# Altium footprint library ref-packages.PCBLIB: 1544 footprints (part 81 of 103) (continued)
## SQFP-S-36X36-280 [mil] (continued)
Top Overlay:
  circle w10: c-637.8,-637.8 r29.53
  lines w8: -699.61,-699.21 699.21,-699.21 699.21,699.21 -699.61,699.21 -699.61,-699.21
Mechanical 16:
  drawing of 284 lines, arcs and shapes, not listed
Mechanical 27:
  lines w7.87: -783.46,-783.46 -783.46,783.46 783.46,783.46 783.46,-783.46 -783.46,-783.46

## SQFP-S-36X36-344 [mm]
pads (344):
  rect 0.25x1.6 smd: 1(-17,-18.6) 2(-16.6,-18.6) 3(-16.2,-18.6) 4(-15.8,-18.6) 5(-15.4,-18.6) 6(-15,-18.6) 7(-14.6,-18.6) 8(-14.2,-18.6) 9(-13.8,-18.6) 10(-13.4,-18.6) 11(-13,-18.6) 12(-12.6,-18.6) 13(-12.2,-18.6) 14(-11.8,-18.6) 15(-11.4,-18.6) 16(-11,-18.6) 17(-10.6,-18.6) 18(-10.2,-18.6) 19(-9.8,-18.6) 20(-9.4,-18.6) 21(-9,-18.6) 22(-8.6,-18.6) 23(-8.2,-18.6) 24(-7.8,-18.6) 25(-7.4,-18.6) 26(-7,-18.6) 27(-6.6,-18.6) 28(-6.2,-18.6) 29(-5.8,-18.6) 30(-5.4,-18.6) 31(-5,-18.6) 32(-4.6,-18.6) 33(-4.2,-18.6) 34(-3.8,-18.6) 35(-3.4,-18.6) 36(-3,-18.6) 37(-2.6,-18.6) 38(-2.2,-18.6) 39(-1.8,-18.6) 40(-1.4,-18.6) 41(-1,-18.6) 42(-0.6,-18.6) 43(-0.2,-18.6) 44(0.2,-18.6) 45(0.6,-18.6) 46(1,-18.6) 47(1.4,-18.6) 48(1.8,-18.6) 49(2.2,-18.6) 50(2.6,-18.6) 51(3,-18.6) 52(3.4,-18.6) 53(3.8,-18.6) 54(4.2,-18.6) 55(4.6,-18.6) 56(5,-18.6) 57(5.4,-18.6) 58(5.8,-18.6) 59(6.2,-18.6) 60(6.6,-18.6) 61(7,-18.6) 62(7.4,-18.6) 63(7.8,-18.6) 64(8.2,-18.6) 65(8.6,-18.6) 66(9,-18.6) 67(9.4,-18.6) 68(9.8,-18.6) 69(10.2,-18.6) 70(10.6,-18.6) 71(11,-18.6) 72(11.4,-18.6) 73(11.8,-18.6) 74(12.2,-18.6) 75(12.6,-18.6) 76(13,-18.6) 77(13.4,-18.6) 78(13.8,-18.6) 79(14.2,-18.6) 80(14.6,-18.6) 81(15,-18.6) 82(15.4,-18.6) 83(15.8,-18.6) 84(16.2,-18.6) 85(16.6,-18.6) 86(17,-18.6) 173(17,18.6) 174(16.6,18.6) 175(16.2,18.6) 176(15.8,18.6) 177(15.4,18.6) 178(15,18.6) 179(14.6,18.6) 180(14.2,18.6) 181(13.8,18.6) 182(13.4,18.6) 183(13,18.6) 184(12.6,18.6) 185(12.2,18.6) 186(11.8,18.6) 187(11.4,18.6) 188(11,18.6) 189(10.6,18.6) 190(10.2,18.6) 191(9.8,18.6) 192(9.4,18.6) 193(9,18.6) 194(8.6,18.6) 195(8.2,18.6) 196(7.8,18.6) 197(7.4,18.6) 198(7,18.6) 199(6.6,18.6) 200(6.2,18.6) 201(5.8,18.6) 202(5.4,18.6) 203(5,18.6) 204(4.6,18.6) 205(4.2,18.6) 206(3.8,18.6) 207(3.4,18.6) 208(3,18.6) 209(2.6,18.6) 210(2.2,18.6) 211(1.8,18.6) 212(1.4,18.6) 213(1,18.6) 214(0.6,18.6) 215(0.2,18.6) 216(-0.2,18.6) 217(-0.6,18.6) 218(-1,18.6) 219(-1.4,18.6) 220(-1.8,18.6) 221(-2.2,18.6) 222(-2.6,18.6) 223(-3,18.6) 224(-3.4,18.6) 225(-3.8,18.6) 226(-4.2,18.6) 227(-4.6,18.6) 228(-5,18.6) 229(-5.4,18.6) 230(-5.8,18.6) 231(-6.2,18.6) 232(-6.6,18.6) 233(-7,18.6) 234(-7.4,18.6) 235(-7.8,18.6) 236(-8.2,18.6) 237(-8.6,18.6) 238(-9,18.6) 239(-9.4,18.6) 240(-9.8,18.6) 241(-10.2,18.6) 242(-10.6,18.6) 243(-11,18.6) 244(-11.4,18.6) 245(-11.8,18.6) 246(-12.2,18.6) 247(-12.6,18.6) 248(-13,18.6) 249(-13.4,18.6) 250(-13.8,18.6) 251(-14.2,18.6) 252(-14.6,18.6) 253(-15,18.6) 254(-15.4,18.6) 255(-15.8,18.6) 256(-16.2,18.6) 257(-16.6,18.6) 258(-17,18.6)
  rect 1.6x0.25 smd: 87(18.6,-17) 88(18.6,-16.6) 89(18.6,-16.2) 90(18.6,-15.8) 91(18.6,-15.4) 92(18.6,-15) 93(18.6,-14.6) 94(18.6,-14.2) 95(18.6,-13.8) 96(18.6,-13.4) 97(18.6,-13) 98(18.6,-12.6) 99(18.6,-12.2) 100(18.6,-11.8) 101(18.6,-11.4) 102(18.6,-11) 103(18.6,-10.6) 104(18.6,-10.2) 105(18.6,-9.8) 106(18.6,-9.4) 107(18.6,-9) 108(18.6,-8.6) 109(18.6,-8.2) 110(18.6,-7.8) 111(18.6,-7.4) 112(18.6,-7) 113(18.6,-6.6) 114(18.6,-6.2) 115(18.6,-5.8) 116(18.6,-5.4) 117(18.6,-5) 118(18.6,-4.6) 119(18.6,-4.2) 120(18.6,-3.8) 121(18.6,-3.4) 122(18.6,-3) 123(18.6,-2.6) 124(18.6,-2.2) 125(18.6,-1.8) 126(18.6,-1.4) 127(18.6,-1) 128(18.6,-0.6) 129(18.6,-0.2) 130(18.6,0.2) 131(18.6,0.6) 132(18.6,1) 133(18.6,1.4) 134(18.6,1.8) 135(18.6,2.2) 136(18.6,2.6) 137(18.6,3) 138(18.6,3.4) 139(18.6,3.8) 140(18.6,4.2) 141(18.6,4.6) 142(18.6,5) 143(18.6,5.4) 144(18.6,5.8) 145(18.6,6.2) 146(18.6,6.6) 147(18.6,7) 148(18.6,7.4) 149(18.6,7.8) 150(18.6,8.2) 151(18.6,8.6) 152(18.6,9) 153(18.6,9.4) 154(18.6,9.8) 155(18.6,10.2) 156(18.6,10.6) 157(18.6,11) 158(18.6,11.4) 159(18.6,11.8) 160(18.6,12.2) 161(18.6,12.6) 162(18.6,13) 163(18.6,13.4) 164(18.6,13.8) 165(18.6,14.2) 166(18.6,14.6) 167(18.6,15) 168(18.6,15.4) 169(18.6,15.8) 170(18.6,16.2) 171(18.6,16.6) 172(18.6,17) 259(-18.6,17) 260(-18.6,16.6) 261(-18.6,16.2) 262(-18.6,15.8) 263(-18.6,15.4) 264(-18.6,15) 265(-18.6,14.6) 266(-18.6,14.2) 267(-18.6,13.8) 268(-18.6,13.4) 269(-18.6,13) 270(-18.6,12.6) 271(-18.6,12.2) 272(-18.6,11.8) 273(-18.6,11.4) 274(-18.6,11) 275(-18.6,10.6) 276(-18.6,10.2) 277(-18.6,9.8) 278(-18.6,9.4) 279(-18.6,9) 280(-18.6,8.6) 281(-18.6,8.2) 282(-18.6,7.8) 283(-18.6,7.4) 284(-18.6,7) 285(-18.6,6.6) 286(-18.6,6.2) 287(-18.6,5.8) 288(-18.6,5.4) 289(-18.6,5) 290(-18.6,4.6) 291(-18.6,4.2) 292(-18.6,3.8) 293(-18.6,3.4) 294(-18.6,3) 295(-18.6,2.6) 296(-18.6,2.2) 297(-18.6,1.8) 298(-18.6,1.4) 299(-18.6,1) 300(-18.6,0.6) 301(-18.6,0.2) 302(-18.6,-0.2) 303(-18.6,-0.6) 304(-18.6,-1) 305(-18.6,-1.4) 306(-18.6,-1.8) 307(-18.6,-2.2) 308(-18.6,-2.6) 309(-18.6,-3) 310(-18.6,-3.4) 311(-18.6,-3.8) 312(-18.6,-4.2) 313(-18.6,-4.6) 314(-18.6,-5) 315(-18.6,-5.4) 316(-18.6,-5.8) 317(-18.6,-6.2) 318(-18.6,-6.6) 319(-18.6,-7) 320(-18.6,-7.4) 321(-18.6,-7.8) 322(-18.6,-8.2) 323(-18.6,-8.6) 324(-18.6,-9) 325(-18.6,-9.4) 326(-18.6,-9.8) 327(-18.6,-10.2) 328(-18.6,-10.6) 329(-18.6,-11) 330(-18.6,-11.4) 331(-18.6,-11.8) 332(-18.6,-12.2) 333(-18.6,-12.6) 334(-18.6,-13) 335(-18.6,-13.4) 336(-18.6,-13.8) 337(-18.6,-14.2) 338(-18.6,-14.6) 339(-18.6,-15) 340(-18.6,-15.4) 341(-18.6,-15.8) 342(-18.6,-16.2) 343(-18.6,-16.6) 344(-18.6,-17)
Top Overlay:
  circle w0.254: c-16.2,-16.2 r0.75
  lines w0.203: -17.77,-17.76 17.76,-17.76 17.76,17.76 -17.77,17.76 -17.77,-17.76
Mechanical 16:
  drawing of 348 lines, arcs and shapes, not listed
Mechanical 27:
  lines w0.2: -19.9,-19.9 -19.9,19.9 19.9,19.9 19.9,-19.9 -19.9,-19.9

## SQFP-S-36X36-352 [mm]
pads (352):
  rect 0.25x1.6 smd: 1(-17.4,-18.6) 2(-17,-18.6) 3(-16.6,-18.6) 4(-16.2,-18.6) 5(-15.8,-18.6) 6(-15.4,-18.6) 7(-15,-18.6) 8(-14.6,-18.6) 9(-14.2,-18.6) 10(-13.8,-18.6) 11(-13.4,-18.6) 12(-13,-18.6) 13(-12.6,-18.6) 14(-12.2,-18.6) 15(-11.8,-18.6) 16(-11.4,-18.6) 17(-11,-18.6) 18(-10.6,-18.6) 19(-10.2,-18.6) 20(-9.8,-18.6) 21(-9.4,-18.6) 22(-9,-18.6) 23(-8.6,-18.6) 24(-8.2,-18.6) 25(-7.8,-18.6) 26(-7.4,-18.6) 27(-7,-18.6) 28(-6.6,-18.6) 29(-6.2,-18.6) 30(-5.8,-18.6) 31(-5.4,-18.6) 32(-5,-18.6) 33(-4.6,-18.6) 34(-4.2,-18.6) 35(-3.8,-18.6) 36(-3.4,-18.6) 37(-3,-18.6) 38(-2.6,-18.6) 39(-2.2,-18.6) 40(-1.8,-18.6) 41(-1.4,-18.6) 42(-1,-18.6) 43(-0.6,-18.6) 44(-0.2,-18.6) 45(0.2,-18.6) 46(0.6,-18.6) 47(1,-18.6) 48(1.4,-18.6) 49(1.8,-18.6) 50(2.2,-18.6) 51(2.6,-18.6) 52(3,-18.6) 53(3.4,-18.6) 54(3.8,-18.6) 55(4.2,-18.6) 56(4.6,-18.6) 57(5,-18.6) 58(5.4,-18.6) 59(5.8,-18.6) 60(6.2,-18.6) 61(6.6,-18.6) 62(7,-18.6) 63(7.4,-18.6) 64(7.8,-18.6) 65(8.2,-18.6) 66(8.6,-18.6) 67(9,-18.6) 68(9.4,-18.6) 69(9.8,-18.6) 70(10.2,-18.6) 71(10.6,-18.6) 72(11,-18.6) 73(11.4,-18.6) 74(11.8,-18.6) 75(12.2,-18.6) 76(12.6,-18.6) 77(13,-18.6) 78(13.4,-18.6) 79(13.8,-18.6) 80(14.2,-18.6) 81(14.6,-18.6) 82(15,-18.6) 83(15.4,-18.6) 84(15.8,-18.6) 85(16.2,-18.6) 86(16.6,-18.6) 87(17,-18.6) 88(17.4,-18.6) 177(17.4,18.6) 178(17,18.6) 179(16.6,18.6) 180(16.2,18.6) 181(15.8,18.6) 182(15.4,18.6) 183(15,18.6) 184(14.6,18.6) 185(14.2,18.6) 186(13.8,18.6) 187(13.4,18.6) 188(13,18.6) 189(12.6,18.6) 190(12.2,18.6) 191(11.8,18.6) 192(11.4,18.6) 193(11,18.6) 194(10.6,18.6) 195(10.2,18.6) 196(9.8,18.6) 197(9.4,18.6) 198(9,18.6) 199(8.6,18.6) 200(8.2,18.6) 201(7.8,18.6) 202(7.4,18.6) 203(7,18.6) 204(6.6,18.6) 205(6.2,18.6) 206(5.8,18.6) 207(5.4,18.6) 208(5,18.6) 209(4.6,18.6) 210(4.2,18.6) 211(3.8,18.6) 212(3.4,18.6) 213(3,18.6) 214(2.6,18.6) 215(2.2,18.6) 216(1.8,18.6) 217(1.4,18.6) 218(1,18.6) 219(0.6,18.6) 220(0.2,18.6) 221(-0.2,18.6) 222(-0.6,18.6) 223(-1,18.6) 224(-1.4,18.6) 225(-1.8,18.6) 226(-2.2,18.6) 227(-2.6,18.6) 228(-3,18.6) 229(-3.4,18.6) 230(-3.8,18.6) 231(-4.2,18.6) 232(-4.6,18.6) 233(-5,18.6) 234(-5.4,18.6) 235(-5.8,18.6) 236(-6.2,18.6) 237(-6.6,18.6) 238(-7,18.6) 239(-7.4,18.6) 240(-7.8,18.6) 241(-8.2,18.6) 242(-8.6,18.6) 243(-9,18.6) 244(-9.4,18.6) 245(-9.8,18.6) 246(-10.2,18.6) 247(-10.6,18.6) 248(-11,18.6) 249(-11.4,18.6) 250(-11.8,18.6) 251(-12.2,18.6) 252(-12.6,18.6) 253(-13,18.6) 254(-13.4,18.6) 255(-13.8,18.6) 256(-14.2,18.6) 257(-14.6,18.6) 258(-15,18.6) 259(-15.4,18.6) 260(-15.8,18.6) 261(-16.2,18.6) 262(-16.6,18.6) 263(-17,18.6) 264(-17.4,18.6)
  rect 1.6x0.25 smd: 89(18.6,-17.4) 90(18.6,-17) 91(18.6,-16.6) 92(18.6,-16.2) 93(18.6,-15.8) 94(18.6,-15.4) 95(18.6,-15) 96(18.6,-14.6) 97(18.6,-14.2) 98(18.6,-13.8) 99(18.6,-13.4) 100(18.6,-13) 101(18.6,-12.6) 102(18.6,-12.2) 103(18.6,-11.8) 104(18.6,-11.4) 105(18.6,-11) 106(18.6,-10.6) 107(18.6,-10.2) 108(18.6,-9.8) 109(18.6,-9.4) 110(18.6,-9) 111(18.6,-8.6) 112(18.6,-8.2) 113(18.6,-7.8) 114(18.6,-7.4) 115(18.6,-7) 116(18.6,-6.6) 117(18.6,-6.2) 118(18.6,-5.8) 119(18.6,-5.4) 120(18.6,-5) 121(18.6,-4.6) 122(18.6,-4.2) 123(18.6,-3.8) 124(18.6,-3.4) 125(18.6,-3) 126(18.6,-2.6) 127(18.6,-2.2) 128(18.6,-1.8) 129(18.6,-1.4) 130(18.6,-1) 131(18.6,-0.6) 132(18.6,-0.2) 133(18.6,0.2) 134(18.6,0.6) 135(18.6,1) 136(18.6,1.4) 137(18.6,1.8) 138(18.6,2.2) 139(18.6,2.6) 140(18.6,3) 141(18.6,3.4) 142(18.6,3.8) 143(18.6,4.2) 144(18.6,4.6) 145(18.6,5) 146(18.6,5.4) 147(18.6,5.8) 148(18.6,6.2) 149(18.6,6.6) 150(18.6,7) 151(18.6,7.4) 152(18.6,7.8) 153(18.6,8.2) 154(18.6,8.6) 155(18.6,9) 156(18.6,9.4) 157(18.6,9.8) 158(18.6,10.2) 159(18.6,10.6) 160(18.6,11) 161(18.6,11.4) 162(18.6,11.8) 163(18.6,12.2) 164(18.6,12.6) 165(18.6,13) 166(18.6,13.4) 167(18.6,13.8) 168(18.6,14.2) 169(18.6,14.6) 170(18.6,15) 171(18.6,15.4) 172(18.6,15.8) 173(18.6,16.2) 174(18.6,16.6) 175(18.6,17) 176(18.6,17.4) 265(-18.6,17.4) 266(-18.6,17) 267(-18.6,16.6) 268(-18.6,16.2) 269(-18.6,15.8) 270(-18.6,15.4) 271(-18.6,15) 272(-18.6,14.6) 273(-18.6,14.2) 274(-18.6,13.8) 275(-18.6,13.4) 276(-18.6,13) 277(-18.6,12.6) 278(-18.6,12.2) 279(-18.6,11.8) 280(-18.6,11.4) 281(-18.6,11) 282(-18.6,10.6) 283(-18.6,10.2) 284(-18.6,9.8) 285(-18.6,9.4) 286(-18.6,9) 287(-18.6,8.6) 288(-18.6,8.2) 289(-18.6,7.8) 290(-18.6,7.4) 291(-18.6,7) 292(-18.6,6.6) 293(-18.6,6.2) 294(-18.6,5.8) 295(-18.6,5.4) 296(-18.6,5) 297(-18.6,4.6) 298(-18.6,4.2) 299(-18.6,3.8) 300(-18.6,3.4) 301(-18.6,3) 302(-18.6,2.6) 303(-18.6,2.2) 304(-18.6,1.8) 305(-18.6,1.4) 306(-18.6,1) 307(-18.6,0.6) 308(-18.6,0.2) 309(-18.6,-0.2) 310(-18.6,-0.6) 311(-18.6,-1) 312(-18.6,-1.4) 313(-18.6,-1.8) 314(-18.6,-2.2) 315(-18.6,-2.6) 316(-18.6,-3) 317(-18.6,-3.4) 318(-18.6,-3.8) 319(-18.6,-4.2) 320(-18.6,-4.6) 321(-18.6,-5) 322(-18.6,-5.4) 323(-18.6,-5.8) 324(-18.6,-6.2) 325(-18.6,-6.6) 326(-18.6,-7) 327(-18.6,-7.4) 328(-18.6,-7.8) 329(-18.6,-8.2) 330(-18.6,-8.6) 331(-18.6,-9) 332(-18.6,-9.4) 333(-18.6,-9.8) 334(-18.6,-10.2) 335(-18.6,-10.6) 336(-18.6,-11) 337(-18.6,-11.4) 338(-18.6,-11.8) 339(-18.6,-12.2) 340(-18.6,-12.6) 341(-18.6,-13) 342(-18.6,-13.4) 343(-18.6,-13.8) 344(-18.6,-14.2) 345(-18.6,-14.6) 346(-18.6,-15) 347(-18.6,-15.4) 348(-18.6,-15.8) 349(-18.6,-16.2) 350(-18.6,-16.6) 351(-18.6,-17) 352(-18.6,-17.4)
Top Overlay:
  circle w0.254: c-16.2,-16.2 r0.75
  lines w0.203: -17.77,-17.76 17.76,-17.76 17.76,17.76 -17.77,17.76 -17.77,-17.76
Mechanical 16:
  drawing of 356 lines, arcs and shapes, not listed
Mechanical 27:
  lines w0.2: -19.9,-19.9 -19.9,19.9 19.9,19.9 19.9,-19.9 -19.9,-19.9

## SQFP-S-36X36-456 [mm]
pads (464):
  rect 0.17x1.6 smd: 1(-17.25,-18.9) 2(-16.95,-18.9) 3(-16.65,-18.9) 4(-16.35,-18.9) 5(-16.05,-18.9) 6(-15.75,-18.9) 7(-15.45,-18.9) 8(-15.15,-18.9) 9(-14.85,-18.9) 10(-14.55,-18.9) 11(-14.25,-18.9) 12(-13.95,-18.9) 13(-13.65,-18.9) 14(-13.35,-18.9) 15(-13.05,-18.9) 16(-12.75,-18.9) 17(-12.45,-18.9) 18(-12.15,-18.9) 19(-11.85,-18.9) 20(-11.55,-18.9) 21(-11.25,-18.9) 22(-10.95,-18.9) 23(-10.65,-18.9) 24(-10.35,-18.9) 25(-10.05,-18.9) 26(-9.75,-18.9) 27(-9.45,-18.9) 28(-9.15,-18.9) 29(-8.85,-18.9) 30(-8.55,-18.9) 31(-8.25,-18.9) 32(-7.95,-18.9) 33(-7.65,-18.9) 34(-7.35,-18.9) 35(-7.05,-18.9) 36(-6.75,-18.9) 37(-6.45,-18.9) 38(-6.15,-18.9) 39(-5.85,-18.9) 40(-5.55,-18.9) 41(-5.25,-18.9) 42(-4.95,-18.9) 43(-4.65,-18.9) 44(-4.35,-18.9) 45(-4.05,-18.9) 46(-3.75,-18.9) 47(-3.45,-18.9) 48(-3.15,-18.9) 49(-2.85,-18.9) 50(-2.55,-18.9) 51(-2.25,-18.9) 52(-1.95,-18.9) 53(-1.65,-18.9) 54(-1.35,-18.9) 55(-1.05,-18.9) 56(-0.75,-18.9) 57(-0.45,-18.9) 58(-0.15,-18.9) 59(0.15,-18.9) 60(0.45,-18.9) 61(0.75,-18.9) 62(1.05,-18.9) 63(1.35,-18.9) 64(1.65,-18.9) 65(1.95,-18.9) 66(2.25,-18.9) 67(2.55,-18.9) 68(2.85,-18.9) 69(3.15,-18.9) 70(3.45,-18.9) 71(3.75,-18.9) 72(4.05,-18.9) 73(4.35,-18.9) 74(4.65,-18.9) 75(4.95,-18.9) 76(5.25,-18.9) 77(5.55,-18.9) 78(5.85,-18.9) 79(6.15,-18.9) 80(6.45,-18.9) 81(6.75,-18.9) 82(7.05,-18.9) 83(7.35,-18.9) 84(7.65,-18.9) 85(7.95,-18.9) 86(8.25,-18.9) 87(8.55,-18.9) 88(8.85,-18.9) 89(9.15,-18.9) 90(9.45,-18.9) 91(9.75,-18.9) 92(10.05,-18.9) 93(10.35,-18.9) 94(10.65,-18.9) 95(10.95,-18.9) 96(11.25,-18.9) 97(11.55,-18.9) 98(11.85,-18.9) 99(12.15,-18.9) 100(12.45,-18.9) 101(12.75,-18.9) 102(13.05,-18.9) 103(13.35,-18.9) 104(13.65,-18.9) 105(13.95,-18.9) 106(14.25,-18.9) 107(14.55,-18.9) 108(14.85,-18.9) 109(15.15,-18.9) 110(15.45,-18.9) 111(15.75,-18.9) 112(16.05,-18.9) 113(16.35,-18.9) 114(16.65,-18.9) 115(16.95,-18.9) 116(17.25,-18.9) 233(17.25,18.9) 234(16.95,18.9) 235(16.65,18.9) 236(16.35,18.9) 237(16.05,18.9) 238(15.75,18.9) 239(15.45,18.9) 240(15.15,18.9) 241(14.85,18.9) 242(14.55,18.9) 243(14.25,18.9) 244(13.95,18.9) 245(13.65,18.9) 246(13.35,18.9) 247(13.05,18.9) 248(12.75,18.9) 249(12.45,18.9) 250(12.15,18.9) 251(11.85,18.9) 252(11.55,18.9) 253(11.25,18.9) 254(10.95,18.9) 255(10.65,18.9) 256(10.35,18.9) 257(10.05,18.9) 258(9.75,18.9) 259(9.45,18.9) 260(9.15,18.9) 261(8.85,18.9) 262(8.55,18.9) 263(8.25,18.9) 264(7.95,18.9) 265(7.65,18.9) 266(7.35,18.9) 267(7.05,18.9) 268(6.75,18.9) 269(6.45,18.9) 270(6.15,18.9) 271(5.85,18.9) 272(5.55,18.9) 273(5.25,18.9) 274(4.95,18.9) 275(4.65,18.9) 276(4.35,18.9) 277(4.05,18.9) 278(3.75,18.9) 279(3.45,18.9) 280(3.15,18.9) 281(2.85,18.9) 282(2.55,18.9) 283(2.25,18.9) 284(1.95,18.9) 285(1.65,18.9) 286(1.35,18.9) 287(1.05,18.9) 288(0.75,18.9) 289(0.45,18.9) 290(0.15,18.9) 291(-0.15,18.9) 292(-0.45,18.9) 293(-0.75,18.9) 294(-1.05,18.9) 295(-1.35,18.9) 296(-1.65,18.9) 297(-1.95,18.9) 298(-2.25,18.9) 299(-2.55,18.9) 300(-2.85,18.9) 301(-3.15,18.9) 302(-3.45,18.9) 303(-3.75,18.9) 304(-4.05,18.9) 305(-4.35,18.9) 306(-4.65,18.9) 307(-4.95,18.9) 308(-5.25,18.9) 309(-5.55,18.9) 310(-5.85,18.9) 311(-6.15,18.9) 312(-6.45,18.9) 313(-6.75,18.9) 314(-7.05,18.9) 315(-7.35,18.9) 316(-7.65,18.9) 317(-7.95,18.9) 318(-8.25,18.9) 319(-8.55,18.9) 320(-8.85,18.9) 321(-9.15,18.9) 322(-9.45,18.9) 323(-9.75,18.9) 324(-10.05,18.9) 325(-10.35,18.9) 326(-10.65,18.9) 327(-10.95,18.9) 328(-11.25,18.9) 329(-11.55,18.9) 330(-11.85,18.9) 331(-12.15,18.9) 332(-12.45,18.9) 333(-12.75,18.9) 334(-13.05,18.9) 335(-13.35,18.9) 336(-13.65,18.9) 337(-13.95,18.9) 338(-14.25,18.9) 339(-14.55,18.9) 340(-14.85,18.9) 341(-15.15,18.9) 342(-15.45,18.9) 343(-15.75,18.9) 344(-16.05,18.9) 345(-16.35,18.9) 346(-16.65,18.9) 347(-16.95,18.9) 348(-17.25,18.9)
  rect 1.6x0.17 smd: 117(18.9,-17.25) 118(18.9,-16.95) 119(18.9,-16.65) 120(18.9,-16.35) 121(18.9,-16.05) 122(18.9,-15.75) 123(18.9,-15.45) 124(18.9,-15.15) 125(18.9,-14.85) 126(18.9,-14.55) 127(18.9,-14.25) 128(18.9,-13.95) 129(18.9,-13.65) 130(18.9,-13.35) 131(18.9,-13.05) 132(18.9,-12.75) 133(18.9,-12.45) 134(18.9,-12.15) 135(18.9,-11.85) 136(18.9,-11.55) 137(18.9,-11.25) 138(18.9,-10.95) 139(18.9,-10.65) 140(18.9,-10.35) 141(18.9,-10.05) 142(18.9,-9.75) 143(18.9,-9.45) 144(18.9,-9.15) 145(18.9,-8.85) 146(18.9,-8.55) 147(18.9,-8.25) 148(18.9,-7.95) 149(18.9,-7.65) 150(18.9,-7.35) 151(18.9,-7.05) 152(18.9,-6.75) 153(18.9,-6.45) 154(18.9,-6.15) 155(18.9,-5.85) 156(18.9,-5.55) 157(18.9,-5.25) 158(18.9,-4.95) 159(18.9,-4.65) 160(18.9,-4.35) 161(18.9,-4.05) 162(18.9,-3.75) 163(18.9,-3.45) 164(18.9,-3.15) 165(18.9,-2.85) 166(18.9,-2.55) 167(18.9,-2.25) 168(18.9,-1.95) 169(18.9,-1.65) 170(18.9,-1.35) 171(18.9,-1.05) 172(18.9,-0.75) 173(18.9,-0.45) 174(18.9,-0.15) 175(18.9,0.15) 176(18.9,0.45) 177(18.9,0.75) 178(18.9,1.05) 179(18.9,1.35) 180(18.9,1.65) 181(18.9,1.95) 182(18.9,2.25) 183(18.9,2.55) 184(18.9,2.85) 185(18.9,3.15) 186(18.9,3.45) 187(18.9,3.75) 188(18.9,4.05) 189(18.9,4.35) 190(18.9,4.65) 191(18.9,4.95) 192(18.9,5.25) 193(18.9,5.55) 194(18.9,5.85) 195(18.9,6.15) 196(18.9,6.45) 197(18.9,6.75) 198(18.9,7.05) 199(18.9,7.35) 200(18.9,7.65) 201(18.9,7.95) 202(18.9,8.25) 203(18.9,8.55) 204(18.9,8.85) 205(18.9,9.15) 206(18.9,9.45) 207(18.9,9.75) 208(18.9,10.05) 209(18.9,10.35) 210(18.9,10.65) 211(18.9,10.95) 212(18.9,11.25) 213(18.9,11.55) 214(18.9,11.85) 215(18.9,12.15) 216(18.9,12.45) 217(18.9,12.75) 218(18.9,13.05) 219(18.9,13.35) 220(18.9,13.65) 221(18.9,13.95) 222(18.9,14.25) 223(18.9,14.55) 224(18.9,14.85) 225(18.9,15.15) 226(18.9,15.45) 227(18.9,15.75) 228(18.9,16.05) 229(18.9,16.35) 230(18.9,16.65) 231(18.9,16.95) 232(18.9,17.25) 349(-18.9,17.25) 350(-18.9,16.95) 351(-18.9,16.65) 352(-18.9,16.35) 353(-18.9,16.05) 354(-18.9,15.75) 355(-18.9,15.45) 356(-18.9,15.15) 357(-18.9,14.85) 358(-18.9,14.55) 359(-18.9,14.25) 360(-18.9,13.95) 361(-18.9,13.65) 362(-18.9,13.35) 363(-18.9,13.05) 364(-18.9,12.75) 365(-18.9,12.45) 366(-18.9,12.15) 367(-18.9,11.85) 368(-18.9,11.55) 369(-18.9,11.25) 370(-18.9,10.95) 371(-18.9,10.65) 372(-18.9,10.35) 373(-18.9,10.05) 374(-18.9,9.75) 375(-18.9,9.45) 376(-18.9,9.15) 377(-18.9,8.85) 378(-18.9,8.55) 379(-18.9,8.25) 380(-18.9,7.95) 381(-18.9,7.65) 382(-18.9,7.35) 383(-18.9,7.05) 384(-18.9,6.75) 385(-18.9,6.45) 386(-18.9,6.15) 387(-18.9,5.85) 388(-18.9,5.55) 389(-18.9,5.25) 390(-18.9,4.95) 391(-18.9,4.65) 392(-18.9,4.35) 393(-18.9,4.05) 394(-18.9,3.75) 395(-18.9,3.45) 396(-18.9,3.15) 397(-18.9,2.85) 398(-18.9,2.55) 399(-18.9,2.25) 400(-18.9,1.95) 401(-18.9,1.65) 402(-18.9,1.35) 403(-18.9,1.05) 404(-18.9,0.75) 405(-18.9,0.45) 406(-18.9,0.15) 407(-18.9,-0.15) 408(-18.9,-0.45) 409(-18.9,-0.75) 410(-18.9,-1.05) 411(-18.9,-1.35) 412(-18.9,-1.65) 413(-18.9,-1.95) 414(-18.9,-2.25) 415(-18.9,-2.55) 416(-18.9,-2.85) 417(-18.9,-3.15) 418(-18.9,-3.45) 419(-18.9,-3.75) 420(-18.9,-4.05) 421(-18.9,-4.35) 422(-18.9,-4.65) 423(-18.9,-4.95) 424(-18.9,-5.25) 425(-18.9,-5.55) 426(-18.9,-5.85) 427(-18.9,-6.15) 428(-18.9,-6.45) 429(-18.9,-6.75) 430(-18.9,-7.05) 431(-18.9,-7.35) 432(-18.9,-7.65) 433(-18.9,-7.95) 434(-18.9,-8.25) 435(-18.9,-8.55) 436(-18.9,-8.85) 437(-18.9,-9.15) 438(-18.9,-9.45) 439(-18.9,-9.75) 440(-18.9,-10.05) 441(-18.9,-10.35) 442(-18.9,-10.65) 443(-18.9,-10.95) 444(-18.9,-11.25) 445(-18.9,-11.55) 446(-18.9,-11.85) 447(-18.9,-12.15) 448(-18.9,-12.45) 449(-18.9,-12.75) 450(-18.9,-13.05) 451(-18.9,-13.35) 452(-18.9,-13.65) 453(-18.9,-13.95) 454(-18.9,-14.25) 455(-18.9,-14.55) 456(-18.9,-14.85) 457(-18.9,-15.15) 458(-18.9,-15.45) 459(-18.9,-15.75) 460(-18.9,-16.05) 461(-18.9,-16.35) 462(-18.9,-16.65) 463(-18.9,-16.95) 464(-18.9,-17.25)
Top Overlay:
  circle w0.254: c-16.2,-16.2 r0.75
  lines w0.203: -17.77,-17.76 17.76,-17.76 17.76,17.76 -17.77,17.76 -17.77,-17.76
Mechanical 16:
  drawing of 468 lines, arcs and shapes, not listed
Mechanical 27:
  lines w0.2: -19.9,-19.9 -19.9,19.9 19.9,19.9 19.9,-19.9 -19.9,-19.9

## SQFP-S-40X40-232 [mm]
pads (232):
  rect 0.4x1.8 smd: 1(-18.525,-21) 2(-17.875,-21) 3(-17.225,-21) 4(-16.575,-21) 5(-15.925,-21) 6(-15.275,-21) 7(-14.625,-21) 8(-13.975,-21) 9(-13.325,-21) 10(-12.675,-21) 11(-12.025,-21) 12(-11.375,-21) 13(-10.725,-21) 14(-10.075,-21) 15(-9.425,-21) 16(-8.775,-21) 17(-8.125,-21) 18(-7.475,-21) 19(-6.825,-21) 20(-6.175,-21) 21(-5.525,-21) 22(-4.875,-21) 23(-4.225,-21) 24(-3.575,-21) 25(-2.925,-21) 26(-2.275,-21) 27(-1.625,-21) 28(-0.975,-21) 29(-0.325,-21) 30(0.325,-21) 31(0.975,-21) 32(1.625,-21) 33(2.275,-21) 34(2.925,-21) 35(3.575,-21) 36(4.225,-21) 37(4.875,-21) 38(5.525,-21) 39(6.175,-21) 40(6.825,-21) 41(7.475,-21) 42(8.125,-21) 43(8.775,-21) 44(9.425,-21) 45(10.075,-21) 46(10.725,-21) 47(11.375,-21) 48(12.025,-21) 49(12.675,-21) 50(13.325,-21) 51(13.975,-21) 52(14.625,-21) 53(15.275,-21) 54(15.925,-21) 55(16.575,-21) 56(17.225,-21) 57(17.875,-21) 58(18.525,-21) 117(18.525,21) 118(17.875,21) 119(17.225,21) 120(16.575,21) 121(15.925,21) 122(15.275,21) 123(14.625,21) 124(13.975,21) 125(13.325,21) 126(12.675,21) 127(12.025,21) 128(11.375,21) 129(10.725,21) 130(10.075,21) 131(9.425,21) 132(8.775,21) 133(8.125,21) 134(7.475,21) 135(6.825,21) 136(6.175,21) 137(5.525,21) 138(4.875,21) 139(4.225,21) 140(3.575,21) 141(2.925,21) 142(2.275,21) 143(1.625,21) 144(0.975,21) 145(0.325,21) 146(-0.325,21) 147(-0.975,21) 148(-1.625,21) 149(-2.275,21) 150(-2.925,21) 151(-3.575,21) 152(-4.225,21) 153(-4.875,21) 154(-5.525,21) 155(-6.175,21) 156(-6.825,21) 157(-7.475,21) 158(-8.125,21) 159(-8.775,21) 160(-9.425,21) 161(-10.075,21) 162(-10.725,21) 163(-11.375,21) 164(-12.025,21) 165(-12.675,21) 166(-13.325,21) 167(-13.975,21) 168(-14.625,21) 169(-15.275,21) 170(-15.925,21) 171(-16.575,21) 172(-17.225,21) 173(-17.875,21) 174(-18.525,21)
  rect 1.8x0.4 smd: 59(21,-18.525) 60(21,-17.875) 61(21,-17.225) 62(21,-16.575) 63(21,-15.925) 64(21,-15.275) 65(21,-14.625) 66(21,-13.975) 67(21,-13.325) 68(21,-12.675) 69(21,-12.025) 70(21,-11.375) 71(21,-10.725) 72(21,-10.075) 73(21,-9.425) 74(21,-8.775) 75(21,-8.125) 76(21,-7.475) 77(21,-6.825) 78(21,-6.175) 79(21,-5.525) 80(21,-4.875) 81(21,-4.225) 82(21,-3.575) 83(21,-2.925) 84(21,-2.275) 85(21,-1.625) 86(21,-0.975) 87(21,-0.325) 88(21,0.325) 89(21,0.975) 90(21,1.625) 91(21,2.275) 92(21,2.925) 93(21,3.575) 94(21,4.225) 95(21,4.875) 96(21,5.525) 97(21,6.175) 98(21,6.825) 99(21,7.475) 100(21,8.125) 101(21,8.775) 102(21,9.425) 103(21,10.075) 104(21,10.725) 105(21,11.375) 106(21,12.025) 107(21,12.675) 108(21,13.325) 109(21,13.975) 110(21,14.625) 111(21,15.275) 112(21,15.925) 113(21,16.575) 114(21,17.225) 115(21,17.875) 116(21,18.525) 175(-21,18.525) 176(-21,17.875) 177(-21,17.225) 178(-21,16.575) 179(-21,15.925) 180(-21,15.275) 181(-21,14.625) 182(-21,13.975) 183(-21,13.325) 184(-21,12.675) 185(-21,12.025) 186(-21,11.375) 187(-21,10.725) 188(-21,10.075) 189(-21,9.425) 190(-21,8.775) 191(-21,8.125) 192(-21,7.475) 193(-21,6.825) 194(-21,6.175) 195(-21,5.525) 196(-21,4.875) 197(-21,4.225) 198(-21,3.575) 199(-21,2.925) 200(-21,2.275) 201(-21,1.625) 202(-21,0.975) 203(-21,0.325) 204(-21,-0.325) 205(-21,-0.975) 206(-21,-1.625) 207(-21,-2.275) 208(-21,-2.925) 209(-21,-3.575) 210(-21,-4.225) 211(-21,-4.875) 212(-21,-5.525) 213(-21,-6.175) 214(-21,-6.825) 215(-21,-7.475) 216(-21,-8.125) 217(-21,-8.775) 218(-21,-9.425) 219(-21,-10.075) 220(-21,-10.725) 221(-21,-11.375) 222(-21,-12.025) 223(-21,-12.675) 224(-21,-13.325) 225(-21,-13.975) 226(-21,-14.625) 227(-21,-15.275) 228(-21,-15.925) 229(-21,-16.575) 230(-21,-17.225) 231(-21,-17.875) 232(-21,-18.525)
Top Overlay:
  circle w0.254: c-18.35,-18.525 r0.75
  lines w0.203: -19.77,-19.76 19.76,-19.76 19.76,19.76 -19.77,19.76 -19.77,-19.76
Mechanical 16:
  drawing of 236 lines, arcs and shapes, not listed
Mechanical 27:
  lines w0.2: -22.4,-22.4 -22.4,22.4 22.4,22.4 22.4,-22.4 -22.4,-22.4